# Altium footprint library led2.PcbLib: 14 footprints
Each footprint in its own frame and in the unit in brackets; x right, y up, seen from the top. Pads: shape width x height; smd on the part's side, far side on the other; paste and mask are expansions set on the pad; w line width, h text height; cw(c..) or ccw(c..) is an arc to the next point about the centre after c.
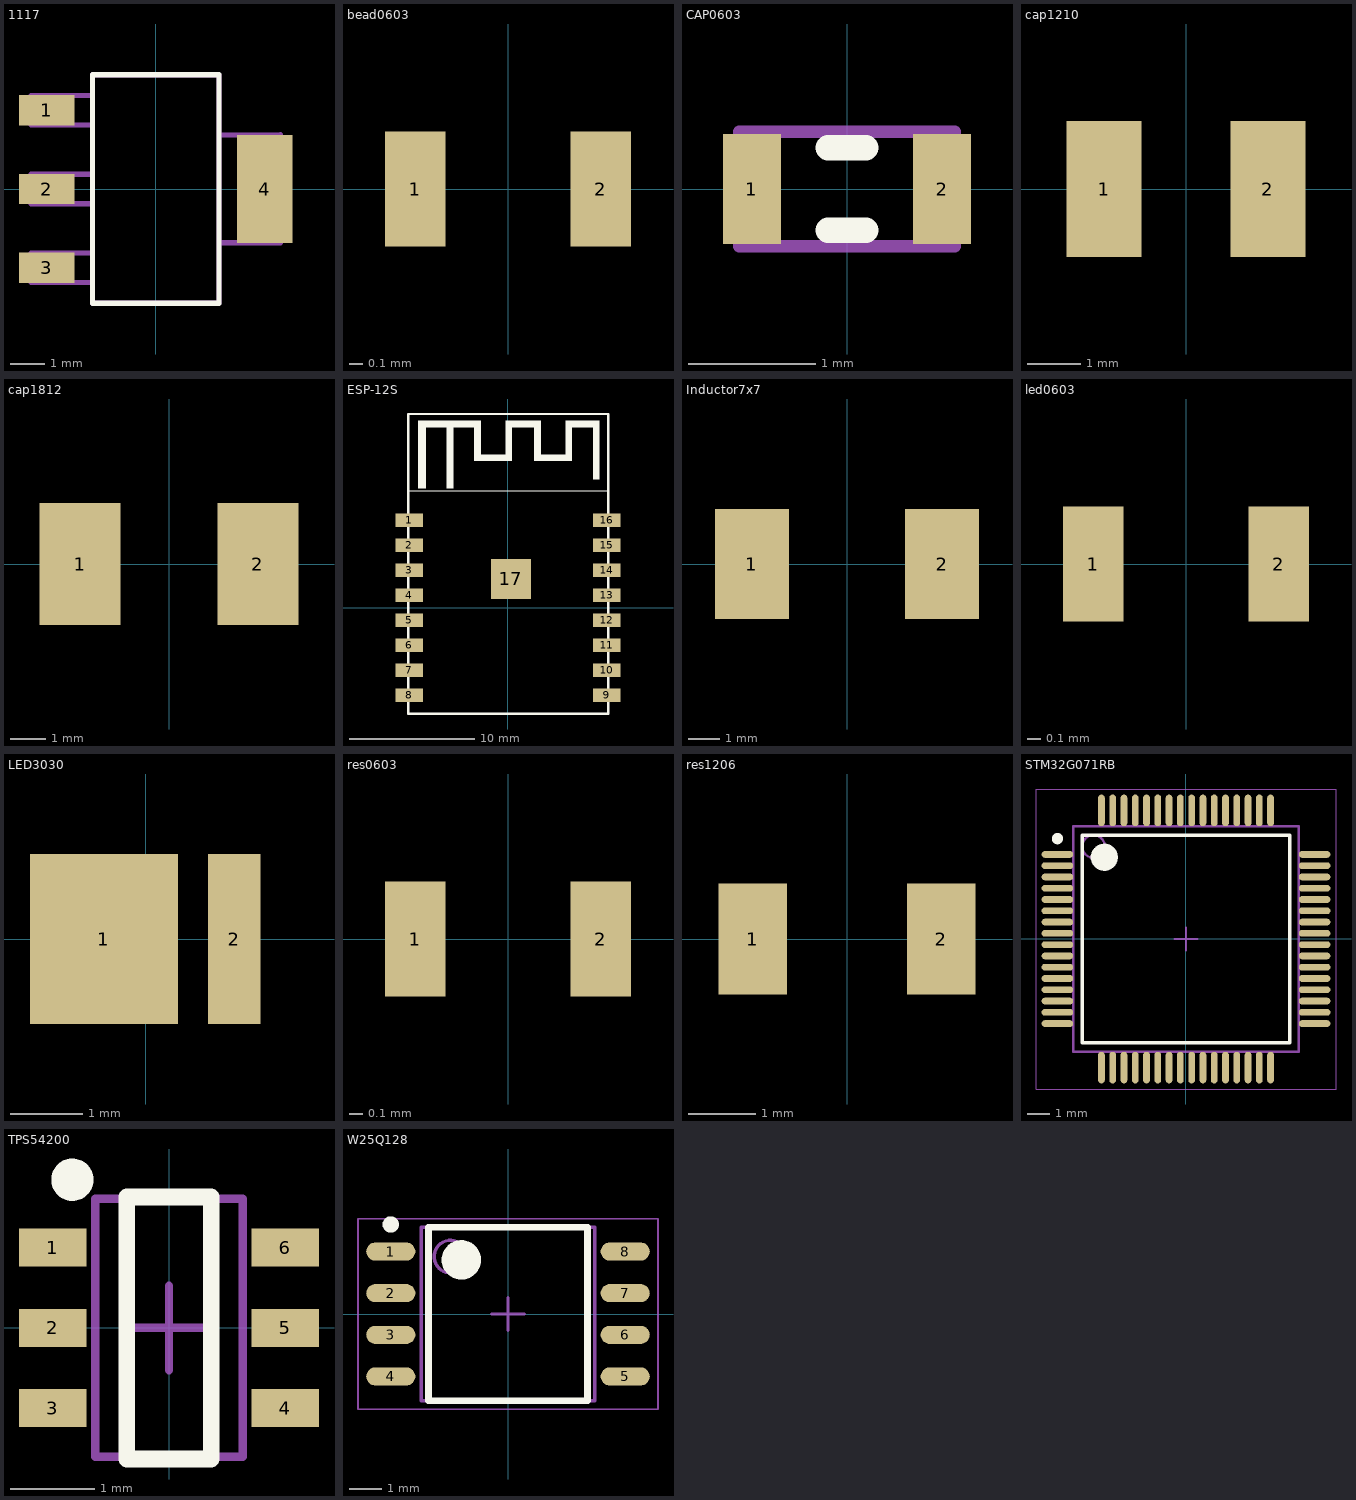
[diagram p0: the footprints below, top view; thin cyan lines are the x and y axes]

## 1117 [mil]
pads (4):
  rect 64x35 smd: 1(-126,91) 2(-126,0) 3(-126,-91)
  rect 64x125 smd: 4(126,0)
Top Overlay:
  lines w6: -73,-132 -73,132 73,132 73,-132 -73,-132
Mechanical 4:
  lines w6: -144,-108 -73,-108 ; -144,-108 -144,-74 ; -144,-108 -73,-108 ; -144,-108 -144,-74 ; -144,-74 -73,-74 ; -144,-74 -73,-74 ; -144,-17 -73,-17 ; -144,-17 -144,17 ; -144,-17 -73,-17 ; -144,-17 -144,17 ; -144,17 -73,17 ; -144,17 -73,17 ; -144,74 -73,74 ; -144,74 -144,108 ; -144,74 -73,74 ; -144,74 -144,108 ; -144,108 -73,108 ; -144,108 -73,108 ; -73,-132 -73,132 ; -73,-132 73,-132 ; -73,-132 -73,132 ; -73,-132 73,-132 ; -73,-108 -73,-74 ; -73,-108 -73,-74 ; -73,-17 -73,17 ; -73,-17 -73,17 ; -73,74 -73,108 ; -73,74 -73,108 ; -73,132 73,132 ; -73,132 73,132 ; 73,-132 73,132 ; 73,-132 73,132 ; 73,-62 144,-62 ; 73,-62 73,62 ; 73,-62 144,-62 ; 73,-62 73,62 ; 73,62 144,63 ; 73,62 144,63 ; 144,-62 144,63 ; 144,-62 144,63
3D body "1117.step": height 70.87, standoff -2.41, extent -137.79,-128.05 137.8,128.05

## bead0603 [mil]
pads (2):
  rect 18x34 smd: 1(-27.5,0) 2(27.5,0)
3D body "bead0603.stp": height 30.75, standoff -0.75, extent -31.5,-15.74 31.5,15.75

## CAP0603 [mil]
height 35.43
pads (2):
  rect 18x34 smd: 1(-29.53,0) 2(29.53,0)
Top Overlay:
  lines w7.87: -5.91,-12.8 5.91,-12.8 ; -5.91,12.8 5.91,12.8
Mechanical 13:
  lines w3.94: -33.46,-17.72 33.46,-17.72 33.46,17.72 -33.46,17.72 -33.46,-17.72
3D body: height 35.43, standoff 0, extent 25.59,-17.72 33.46,17.72
3D body: height 35.43, standoff 0, extent -33.46,-17.72 -25.59,17.72
3D body: height 35.43, standoff 0, extent -25.59,-17.72 25.59,17.72

## cap1210 [mil]
pads (2):
  rect 55x100 smd: 1(-60,0) 2(60,0)
3D body "C1210.STEP": height 37.4, standoff 0, extent -62.99,-49.21 63,49.22

## cap1812 [mil]
pads (2):
  rect 90x135 smd: 1(-98.43,0) 2(98.43,0)
3D body "cap1812.stp": height 62.76, standoff 1.74, extent -98.45,-68 94.46,69.79

## ESP-12S [mm]
pads (17):
  rect 2.2x1.1 smd: 1(-7.9,7) 2(-7.9,5) 3(-7.9,3) 4(-7.9,1) 5(-7.9,-1) 6(-7.9,-3) 7(-7.9,-5) 8(-7.9,-7) 9(7.9,-7) 10(7.9,-5) 11(7.9,-3) 12(7.9,-1) 13(7.9,1) 14(7.9,3) 15(7.9,5) 16(7.9,7)
  rect 3.2x3.2 smd: 17(0.22,2.321)
Top Overlay:
  region: -7.196,14.463 -7.196,14.963 -2.196,14.963 -2.196,12.263 -0.196,12.263 -0.196,14.963 2.604,14.963 2.604,12.263 4.604,12.263 4.604,14.963 7.304,14.963 7.304,10.29 6.804,10.29 6.804,14.463 5.104,14.463 5.104,11.763 2.104,11.763 2.104,14.463 0.304,14.463 0.304,11.763 -2.696,11.763 -2.696,14.463 -4.396,14.463 -4.396,9.563 -4.896,9.563 -4.896,14.463
  region: -7.196,14.716 -7.196,9.563 -6.569,9.563 -6.569,14.716
  lines w0.1: -8,9.354 8,9.354
  lines w0.2: -8,-8.496 8,-8.496 8,15.504 -8,15.504 -8,-8.496
3D body "ESP07-1.step": height 3.5, standoff -0.01, extent -7.956,-8.435 8.044,13.565

## Inductor7x7 [mm]
pads (2):
  rect 2.35x3.5 smd: 1(-3.025,0) 2(3.025,0)
3D body: height 0.97, standoff 0, extent -2.388,2.388 -2.388,2.388
3D body: height 1.27, standoff 0, extent -1.4,2.5 -1.4,2.5
3D body: height 3, standoff 1.27, extent -3.65,-3.3 3.65,3.3

## led0603 [mil]
pads (2):
  rect 18x34 smd: 1(-27.5,0) 2(27.5,0)
3D body "led0603.STEP": height 23.62, standoff 0, extent -31.89,-15.74 31.9,15.75

## LED3030 [mm]
pads (2):
  rect 2.05x2.35 smd: 1(-0.575,0)
  rect 0.725x2.35 smd: 2(1.225,0)
3D body "LED3030.step": height 0.51, standoff 0, extent -1.524,-1.524 1.524,1.524

## res0603 [mil]
pads (2):
  rect 18x34 smd: 1(-27.5,0) 2(27.5,0)
3D body "res0603.stp": height 17.71, standoff 0, extent -30.51,-16.73 30.52,16.74

## res1206 [mil]
pads (2):
  rect 40x65 smd: 1(-55.12,0) 2(55.12,0)
3D body "R1206.step": height 21.65, standoff 0, extent -59.24,-30.5 59.26,30.52

## STM32G071RB [mm]
height 1.6
pads (64):
  oval 1.4x0.3 smd: 1(-5.7,3.75) 2(-5.7,3.25) 3(-5.7,2.75) 4(-5.7,2.25) 5(-5.7,1.75) 6(-5.7,1.25) 7(-5.7,0.75) 8(-5.7,0.25) 9(-5.7,-0.25) 10(-5.7,-0.75) 11(-5.7,-1.25) 12(-5.7,-1.75) 13(-5.7,-2.25) 14(-5.7,-2.75) 15(-5.7,-3.25) 16(-5.7,-3.75) 33(5.7,-3.75) 34(5.7,-3.25) 35(5.7,-2.75) 36(5.7,-2.25) 37(5.7,-1.75) 38(5.7,-1.25) 39(5.7,-0.75) 40(5.7,-0.25) 41(5.7,0.25) 42(5.7,0.75) 43(5.7,1.25) 44(5.7,1.75) 45(5.7,2.25) 46(5.7,2.75) 47(5.7,3.25) 48(5.7,3.75)
  oval 0.3x1.4 smd: 17(-3.75,-5.7) 18(-3.25,-5.7) 19(-2.75,-5.7) 20(-2.25,-5.7) 21(-1.75,-5.7) 22(-1.25,-5.7) 23(-0.75,-5.7) 24(-0.25,-5.7) 25(0.25,-5.7) 26(0.75,-5.7) 27(1.25,-5.7) 28(1.75,-5.7) 29(2.25,-5.7) 30(2.75,-5.7) 31(3.25,-5.7) 32(3.75,-5.7) 49(3.75,5.7) 50(3.25,5.7) 51(2.75,5.7) 52(2.25,5.7) 53(1.75,5.7) 54(1.25,5.7) 55(0.75,5.7) 56(0.25,5.7) 57(-0.25,5.7) 58(-0.75,5.7) 59(-1.25,5.7) 60(-1.75,5.7) 61(-2.25,5.7) 62(-2.75,5.7) 63(-3.25,5.7) 64(-3.75,5.7)
Top Overlay:
  circle w0.6: c-3.625,3.625 r0.3
  circle w0.25: c-5.7,4.45 r0.125
  lines w0.15: -4.6,-4.6 4.6,-4.6 4.6,4.6 -4.6,4.6 -4.6,-4.6
Mechanical 13:
  circle w0.1: c-4.1,4.1 r0.5
  lines w0.1: -5,-5 5,-5 5,5 -5,5 -5,-5
Mechanical 15:
  lines w0.05: -6.65,-6.65 6.65,-6.65 6.65,6.65 -6.65,6.65 -6.65,-6.65
  lines w0.1: -0.5,0 0.5,0 ; 0,-0.5 0,0.5
3D body "STM32F107 -LQFP64.step": height 1.6, standoff 0.01, extent -5.999,-5.999 5.999,5.999

## TPS54200 [mm] "SOT23, 6-Leads, Body 2.90x2.80mm, Pitch 0.95mm, IPC Medium Density"
height 1.1
pads (6):
  rect 0.8x0.45 smd: 1(-1.375,0.95) 2(-1.375,0) 3(-1.375,-0.95) 4(1.375,-0.95) 5(1.375,0) 6(1.375,0.95)
Top Overlay:
  circle w0.25: c-1.143,1.753 r0.125
  lines w0.2: -0.5,-1.55 -0.5,1.55 0.5,1.55 0.5,-1.55 -0.5,-1.55
Mechanical 13:
  lines w0.1: -0.875,-1.525 0.875,-1.525 0.875,1.525 -0.875,1.525 -0.875,-1.525
Mechanical 15:
  lines w0.1: -0.5,0 0.5,0 ; 0,-0.5 0,0.5
3D body "tsp54200.stp": height 0.97, standoff 0, extent -1.4,-1.45 1.4,1.45

## W25Q128 [mm] "SOIC, 8-Leads, Body 5.23x5.23mm, Pitch 1.27mm, IPC Medium Density"
height 2.16
pads (8):
  oval 1.5x0.55 smd: 1(-3.575,1.905) 2(-3.575,0.635) 3(-3.575,-0.635) 4(-3.575,-1.905) 5(3.575,-1.905) 6(3.575,-0.635) 7(3.575,0.635) 8(3.575,1.905)
Top Overlay:
  circle w0.25: c-3.575,2.73 r0.125
  circle w0.6: c-1.425,1.65 r0.3
  lines w0.2: -2.425,-2.65 -2.425,2.65 2.425,2.65 2.425,-2.65 -2.425,-2.65
Mechanical 13:
  circle w0.1: c-1.75,1.75 r0.5
  lines w0.1: -2.65,-2.65 -2.65,2.65 2.65,2.65 2.65,-2.65 -2.65,-2.65
Mechanical 15:
  lines w0.05: -4.575,-2.9 -4.575,2.9 4.575,2.9 4.575,-2.9 -4.575,-2.9
  lines w0.1: -0.5,0 0.5,0 ; 0,-0.5 0,0.5
3D body: height 2.16, standoff 0.05, extent -2.65,-2.65 2.65,2.65